# Altium footprint library Elements_LT.PcbLib: 145 footprints (part 7 of 10)
Each footprint in its own frame and in the unit in brackets; x right, y up, seen from the top. Pads: shape width x height; smd on the part's side, far side on the other; paste and mask are expansions set on the pad; w line width, h text height; cw(c..) or ccw(c..) is an arc to the next point about the centre after c.
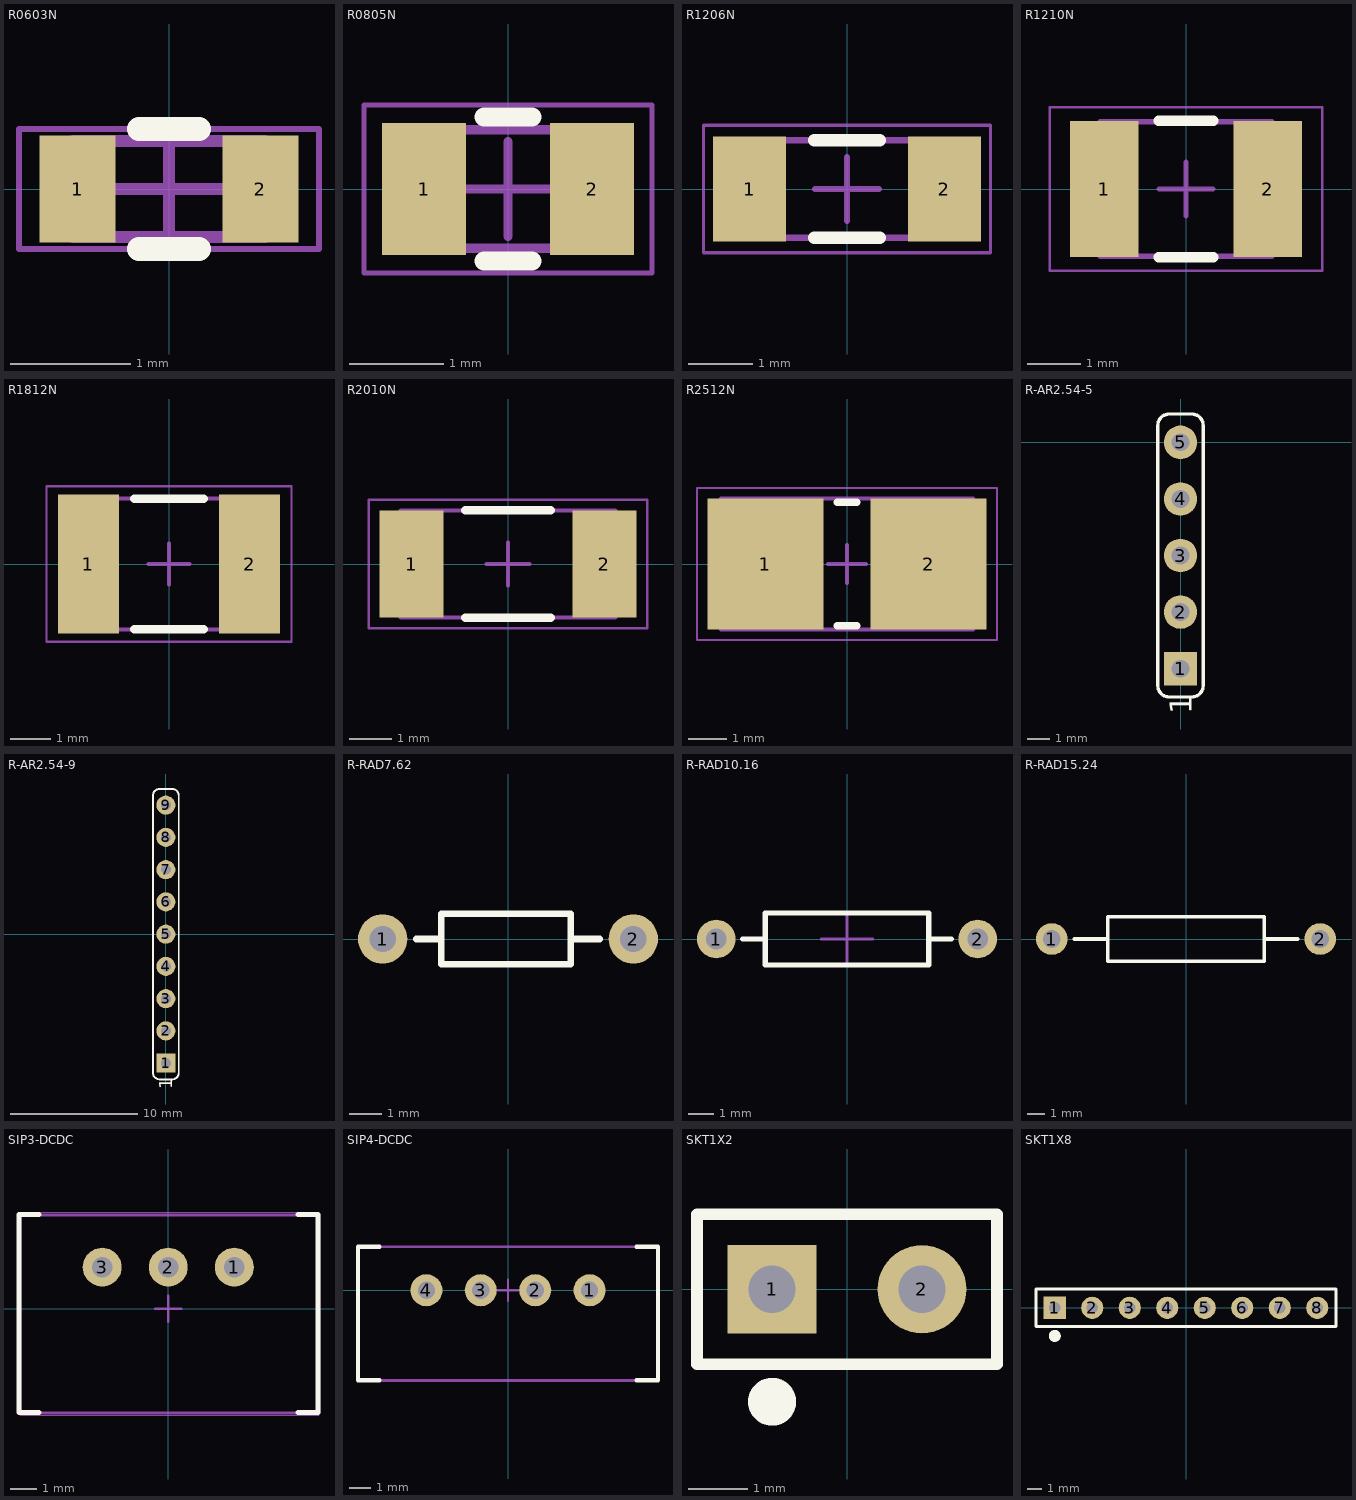
[diagram p6: the footprints below, top view; thin cyan lines are the x and y axes]

## R0603N [mil] "Resistor, SMD, 0603 / 1608"
height 21.65
pads (2):
  rect 25x35 smd: 1(-30,0) 2(30,0)
Top Overlay:
  lines w7.87: -9.84,-19.68 9.84,-19.68 ; -9.84,19.68 9.84,19.68
Mechanical 13:
  lines w3.94: -31.49,-15.75 -31.49,15.75 31.5,15.75 31.5,-15.75 -31.49,-15.75
Mechanical 15:
  lines w1.97: -49.21,-19.68 -49.21,19.68 49.21,19.68 49.21,-19.68 -49.21,-19.68
  lines w3.94: -18.7,0 18.7,0 ; 0,-18.7 0,18.7
3D body "0603_RES.stp": height 16.93, standoff -1.18, extent -31.49,-15.75 31.5,15.75

## R0805N [mil] "Resistor, SMD, 0805 / 2012"
height 39.37
pads (2):
  rect 35x55 smd: 1(-35,0) 2(35,0)
Top Overlay:
  lines w7.87: -10,-30 10,-30 ; -10,30 10,30
Mechanical 13:
  lines w3.94: -39.37,-24.6 -39.37,24.61 39.37,24.61 39.37,-24.6 -39.37,-24.6
Mechanical 15:
  lines w1.97: -60,-35 60,-35 60,35 -60,35 -60,-35
  lines w3.94: -19.68,0 19.69,0 ; 0,-19.68 0,19.69
3D body "0805_RES.stp": height 24.02, standoff 0, extent -39.37,-24.61 39.37,24.61

## R1206N [mil] "Resistor, SMD, 1206 / 3216"
height 23.62
pads (2):
  rect 45x65 smd: 1(-60,0) 2(60,0)
Top Overlay:
  lines w7.87: -20,-30 20,-30 ; -20,30 20,30
Mechanical 13:
  lines w3.94: -62.99,-30.11 -62.99,30.12 63,30.12 63,-30.11 -62.99,-30.11
Mechanical 15:
  lines w1.97: -88.58,-39.37 88.58,-39.37 88.58,39.37 -88.58,39.37 -88.58,-39.37
  lines w3.94: -19.68,0 19.69,0 ; 0,-19.69 0,19.68
3D body "1206_RES.stp": height 22.83, standoff -1.18, extent -62.89,-31.58 63.09,31.42

## R1210N [mil] "Resistor, SMD, 1210 / 3225"
height 31.5
pads (2):
  rect 50x100 smd: 1(-60,0) 2(60,0)
Top Overlay:
  lines w7.87: -20,-50 20,-50 ; -20,50 20,50
Mechanical 13:
  lines w3.94: -62.99,-49.21 63,-49.21 63,49.22 -62.99,49.22 -62.99,-49.21
Mechanical 15:
  lines w1.97: -100,-60 -100,60 100,60 100,-60 -100,-60
  lines w3.94: -19.68,0 19.69,0 ; 0,-19.68 0,19.68
3D body "1210_RES.stp": height 24.02, standoff 0, extent -62.99,-49.21 62.99,49.21

## R1812N [mm] "Resistor, SMD, 1812 / 4532"
height 0.89
pads (2):
  rect 1.5x3.4 smd: 1(-1.975,0) 2(1.975,0)
Top Overlay:
  lines w0.2: -0.85,-1.6 0.85,-1.6 ; -0.85,1.6 0.85,1.6
Mechanical 13:
  lines w0.1: -2.25,-1.6 -2.25,1.6 2.25,1.6 2.25,-1.6 -2.25,-1.6
Mechanical 15:
  lines w0.05: -3,-1.905 -3,1.905 3,1.905 3,-1.905 -3,-1.905
  lines w0.1: -0.5,0 0.5,0 ; 0,-0.5 0,0.5
3D body "1812_RES.stp": height 0.58, standoff -0.03, extent -2.275,-1.6 2.225,1.6

## R2010N [mm] "Resistor, SMD, 2010 / 5025"
height 1.35
pads (2):
  rect 1.5x2.5 smd: 1(-2.25,0) 2(2.25,0)
Top Overlay:
  lines w0.2: -1,-1.25 1,-1.25 ; -1,1.25 1,1.25
Mechanical 13:
  lines w0.1: -2.5,-1.25 2.5,-1.25 2.5,1.25 -2.5,1.25 -2.5,-1.25
Mechanical 15:
  lines w0.05: -3.25,-1.5 3.25,-1.5 3.25,1.5 -3.25,1.5 -3.25,-1.5
  lines w0.1: -0.5,0 0.5,0 ; 0,-0.5 0,0.5
3D body "2010_RES.stp": height 0.58, standoff -0.03, extent -2.5,-1.25 2.5,1.25

## R2512N [mm] "Resistor, SMD, 2512 / 6432"
height 1.35
pads (2):
  rect 3.05x3.45 smd: 1(-2.15,0) 2(2.15,0)
Top Overlay:
  lines w0.2: -0.25,-1.625 0.25,-1.625 ; -0.25,1.625 0.25,1.625
Mechanical 13:
  lines w0.1: -3.325,-1.725 -3.325,1.725 3.325,1.725 3.325,-1.725 -3.325,-1.725
Mechanical 15:
  lines w0.05: -3.95,-2 -3.95,2 3.95,2 3.95,-2 -3.95,-2
  lines w0.1: -0.5,0 0.5,0 ; 0,-0.5 0,0.5
3D body "2512_RES.stp": height 0.58, standoff -0.03, extent -3.185,-1.6 3.235,1.6

## R-AR2.54-5 [mm] "Resistor Array, THT, Pitch 100mil / 2.54mm, 5 Pins"
pads (5):
  rect 1.5x1.5 hole 0.8: 1(0,-10.16)
  round 1.5 hole 0.8: 2(0,-7.62) 3(0,-5.08) 4(0,-2.54) 5(0,0)
Top Overlay:
  lines w0.152: -1.016,-10.922 ccw(c-0.508,-10.922) -0.508,-11.43 0.508,-11.43 ccw(c0.508,-10.922) 1.016,-10.922 1.016,0.762 ccw(c0.508,0.762) 0.508,1.27 -0.508,1.27 ccw(c-0.508,0.762) -1.016,0.762 -1.016,-10.922
  text "1" at 0.508,-12.192 h1

## R-AR2.54-9 [mm] "Resistor Array, THT, Pitch 100mil / 2.54mm, 9 Pins"
pads (9):
  rect 1.5x1.5 hole 0.8: 1(0,-10.16)
  round 1.5 hole 0.8: 2(0,-7.62) 3(0,-5.08) 4(0,-2.54) 5(0,0) 6(0,2.54) 7(0,5.08) 8(0,7.62) 9(0,10.16)
Top Overlay:
  lines w0.152: -1.016,-10.922 ccw(c-0.508,-10.922) -0.508,-11.43 0.508,-11.43 ccw(c0.508,-10.922) 1.016,-10.922 1.016,10.922 ccw(c0.508,10.922) 0.508,11.43 -0.508,11.43 ccw(c-0.508,10.922) -1.016,10.922 -1.016,-10.922
  text "1" at 0.508,-12.192 h1
3D body "SW3dPS-Resistor Networks-1.STEP": height 5, standoff -3.5, extent -0.615,-11.25 0.635,11.25

## R-RAD7.62 [mm] "Resistor, THT, Pitch 300mil / 7.62mm"
pads (2):
  round 1.5 hole 0.8: 1(-3.81,0) 2(3.81,0)
Top Overlay:
  lines w0.2: -2.794,0 -2.032,0 ; 1.905,0 2.794,0 ; -2.032,-0.762 1.905,-0.762 1.905,0.762 -2.032,0.762 -2.032,-0.762
3D body "07.stp": height 2.77, standoff -1.78, extent -4.129,-1.25 4.129,1.242

## R-RAD10.16 [mm] "Resistor, THT, Pitch 400mil / 10.16mm"
pads (2):
  round 1.5 hole 0.8: 1(-5.08,0) 2(5.08,0)
Top Overlay:
  lines w0.2: -4.064,0 -3.175,0 ; 3.175,0 4.064,0 ; -3.175,-1.016 3.175,-1.016 3.175,1.016 -3.175,1.016 -3.175,-1.016
Mechanical 15:
  lines w0.1: -1,0 1,0 ; 0,-1 0,1
3D body "SW3dPS-RESISTOR, 0.25 W, 0.4 IN LEAD PITCH.STEP": height 2.93, standoff -2.54, extent -5.385,-1.156 5.385,1.156

## R-RAD15.24 [mm] "Resistor, THT, Pitch 600mil / 15.24mm"
pads (2):
  round 1.8 hole 1: 1(-7.62,0) 2(7.62,0)
Top Overlay:
  lines w0.2: -6.35,0 -4.445,0 ; 4.445,0 6.35,0 ; -4.445,-1.27 -4.445,1.27 4.445,1.27 4.445,-1.27 -4.445,-1.27
3D body "15.stp": height 3.89, standoff -2.6, extent -7.929,-1.9 7.929,1.9

## SIP3-DCDC [mm] "SIP Linear Regulator Replacement"
height 10.16
pads (3):
  round 1.5 hole 0.8: 1(2.54,1.6) 2(0,1.6) 3(-2.54,1.6)
Top Overlay:
  lines w0.2: -4.98,-3.988 -5.742,-3.988 -5.742,3.632 -4.98,3.632 ; 5.001,-3.988 5.763,-3.988 5.763,3.632 5.001,3.632
Mechanical 13:
  lines w0.1: -5.7,-4 -5.7,3.6 5.8,3.6 5.8,-4 -5.7,-4
Mechanical 15:
  lines w0.05: -5.7,-4.1 -5.7,3.7 5.8,3.7 5.8,-4.1 -5.7,-4.1
  lines w0.1: -0.5,0 0.5,0 ; 0,-0.5 0,0.5
3D body: height 10.2, standoff 0.5, extent -5.7,-4 5.8,3.6

## SIP4-DCDC [mm] "SIP Linear Regulator Replacement"
height 10
pads (4):
  round 1.5 hole 0.8: 1(3.81,0) 2(1.27,0) 3(-1.27,0) 4(-3.81,0)
Top Overlay:
  lines w0.2: -6,-4.2 -7,-4.2 -7,2.032 -6,2.032 ; 6,-4.2 7,-4.2 7,2.032 6,2.032
Mechanical 13:
  lines w0.1: -7,2.032 7,2.032 7,-4.2 -7,-4.2 -7,2.032 ; -7,2.032 -7,2.032
Mechanical 15:
  lines w0.05: -7,-4.25 -7,2 7,2 7,-4.25 -7,-4.25
  lines w0.1: -0.5,0 0.5,0 ; 0,-0.5 0,0.5
3D body: height 10.2, standoff 0.5, extent -7,-4.2 7,2.032

## SKT1X2 [mm] "Connector; Socket; 2 Position"
pads (2):
  rect 1.5x1.5 hole 0.8: 1(-1.27,0)
  round 1.5 hole 0.8: 2(1.27,0)
Top Overlay:
  circle w0.406: c-1.27,-1.905 r0.203
  lines w0.2: -2.54,-1.27 2.54,-1.27 2.54,1.27 -2.54,1.27 -2.54,-1.27
3D body "socket1.step": height 7, standoff -3.1, extent -2.54,-1.25 -0.04,1.25
3D body "socket1.step": height 7, standoff -3.1, extent 0,-1.25 2.5,1.25

## SKT1X8 [mm] "Connector; Socket; 8 Position"
pads (8):
  rect 1.5x1.5 hole 0.8: 1(-8.89,0)
  round 1.5 hole 0.8: 2(-6.35,0) 3(-3.81,0) 4(-1.27,0) 5(1.27,0) 6(3.81,0) 7(6.35,0) 8(8.89,0)
Top Overlay:
  circle w0.406: c-8.89,-1.905 r0.203
  lines w0.2: -10.16,-1.27 -10.16,1.27 10.16,1.27 10.16,-1.27 -10.16,-1.27
3D body "socket1.step": height 7, standoff -3.1, extent 7.62,-1.25 10.119,1.25
3D body "socket1.step": height 7, standoff -3.1, extent 5.08,-1.25 7.579,1.25
3D body "socket1.step": height 7, standoff -3.1, extent 2.54,-1.25 5.039,1.25
3D body "socket1.step": height 7, standoff -3.1, extent 0,-1.25 2.499,1.25
3D body "socket1.step": height 7, standoff -3.1, extent -2.54,-1.25 -0.041,1.25
3D body "socket1.step": height 7, standoff -3.1, extent -5.08,-1.25 -2.581,1.25
3D body "socket1.step": height 7, standoff -3.1, extent -7.62,-1.25 -5.12,1.25
3D body "socket1.step": height 7, standoff -3.1, extent -10.16,-1.25 -7.66,1.25